# Altium integrated library Rosenberger HSD.IntLib: 118 symbols (part 1 of 2) (continued)
## D4S10A-400L5-C-RECEIVER (continued)
HSD Straight Plug, Coding C (Blue), Up to 5 GBit/s Per Pair, Receiver Side; PartNumber: D4S10A-400L5-C-RECEIVER; Design Note 1: Footprint in library is a generic example - only application specific footprint delivers High Performance; Design Note 2: A HSD 1-to-1 connection always needs an Emitter AND Receiver symbol, because the cable has a A->B direction, the pinning must be crossed.; DatasheetVersion: 902; PackageVersion: 902; PackageReference: D4S10A-400L5-C; PackageDescription: HSD Straight Plug, 12 x 14.15 x 15.4 mm; Coding: C (Blue); Mounting Technology: Through Hole; ComponentLink1Description: Manufacturer URL; ComponentLink1URL: http://www.rosenberger.de; ComponentLink2Description: Datasheet; ComponentLink2URL: http://rosenberger.de/ok/images/documents/db/D4S10A-400L5-Y.pdf; ComponentLink3Description: Package Specification; ComponentLink3URL: http://rosenberger.de/ok/images/documents/db/D4S10A-400L5-Y.pdf; ComponentLink4Description: Series Overview / Design Note; ComponentLink4URL: http://rosenberger.de/ok/images/documents/spez/hsd.pdf; ComponentLink5Description: Webshop / RFQ; ComponentLink5URL: http://www.rosenberger.com/en/contact/sales/
footprint ROS-D4S10A-400L5-C_V (HSD Straight Plug, 12x14.15x15.4mm, Rosenberger Recommended)
pins: 1, 2, 3, 4, MH
text: Pair A; Pair B

## D4S10A-400L5-D-EMITTER
designator P?
HSD Straight Plug, Coding D (Bordeaux), Up to 5 GBit/s Per Pair, Emitter Side; PartNumber: D4S10A-400L5-D-EMITTER; Design Note 1: Footprint in library is a generic example - only application specific footprint delivers High Performance; Design Note 2: A HSD 1-to-1 connection always needs an Emitter AND Receiver symbol, because the cable has a A->B direction, the pinning must be crossed.; DatasheetVersion: 902; PackageVersion: 902; PackageReference: D4S10A-400L5-D; PackageDescription: HSD Straight Plug, 12 x 14.15 x 15.4 mm; Coding: D (Bordeaux); Mounting Technology: Through Hole; ComponentLink1Description: Manufacturer URL; ComponentLink1URL: http://www.rosenberger.de; ComponentLink2Description: Datasheet; ComponentLink2URL: http://rosenberger.de/ok/images/documents/db/D4S10A-400L5-Y.pdf; ComponentLink3Description: Package Specification; ComponentLink3URL: http://rosenberger.de/ok/images/documents/db/D4S10A-400L5-Y.pdf; ComponentLink4Description: Series Overview / Design Note; ComponentLink4URL: http://rosenberger.de/ok/images/documents/spez/hsd.pdf; ComponentLink5Description: Webshop / RFQ; ComponentLink5URL: http://www.rosenberger.com/en/contact/sales/
footprint ROS-D4S10A-400L5-D_V (HSD Straight Plug, 12x14.15x15.4mm, Rosenberger Recommended)
pins: 1, 2, 3, 4, MH
text: Pair A; Pair B

## D4S10A-400L5-D-RECEIVER
designator P?
HSD Straight Plug, Coding D (Bordeaux), Up to 5 GBit/s Per Pair, Receiver Side; PartNumber: D4S10A-400L5-D-RECEIVER; Design Note 1: Footprint in library is a generic example - only application specific footprint delivers High Performance; Design Note 2: A HSD 1-to-1 connection always needs an Emitter AND Receiver symbol, because the cable has a A->B direction, the pinning must be crossed.; DatasheetVersion: 902; PackageVersion: 902; PackageReference: D4S10A-400L5-D; PackageDescription: HSD Straight Plug, 12 x 14.15 x 15.4 mm; Coding: D (Bordeaux); Mounting Technology: Through Hole; ComponentLink1Description: Manufacturer URL; ComponentLink1URL: http://www.rosenberger.de; ComponentLink2Description: Datasheet; ComponentLink2URL: http://rosenberger.de/ok/images/documents/db/D4S10A-400L5-Y.pdf; ComponentLink3Description: Package Specification; ComponentLink3URL: http://rosenberger.de/ok/images/documents/db/D4S10A-400L5-Y.pdf; ComponentLink4Description: Series Overview / Design Note; ComponentLink4URL: http://rosenberger.de/ok/images/documents/spez/hsd.pdf; ComponentLink5Description: Webshop / RFQ; ComponentLink5URL: http://www.rosenberger.com/en/contact/sales/
footprint ROS-D4S10A-400L5-D_V (HSD Straight Plug, 12x14.15x15.4mm, Rosenberger Recommended)
pins: 1, 2, 3, 4, MH
text: Pair A; Pair B

## D4S10A-400L5-E-EMITTER
designator P?
HSD Straight Plug, Coding E (Green), Up to 5 GBit/s Per Pair, Emitter Side; PartNumber: D4S10A-400L5-E-EMITTER; Design Note 1: Footprint in library is a generic example - only application specific footprint delivers High Performance; Design Note 2: A HSD 1-to-1 connection always needs an Emitter AND Receiver symbol, because the cable has a A->B direction, the pinning must be crossed.; DatasheetVersion: 902; PackageVersion: 902; PackageReference: D4S10A-400L5-E; PackageDescription: HSD Straight Plug, 12 x 14.15 x 15.4 mm; Coding: E (Green); Mounting Technology: Through Hole; ComponentLink1Description: Manufacturer URL; ComponentLink1URL: http://www.rosenberger.de; ComponentLink2Description: Datasheet; ComponentLink2URL: http://rosenberger.de/ok/images/documents/db/D4S10A-400L5-Y.pdf; ComponentLink3Description: Package Specification; ComponentLink3URL: http://rosenberger.de/ok/images/documents/db/D4S10A-400L5-Y.pdf; ComponentLink4Description: Series Overview / Design Note; ComponentLink4URL: http://rosenberger.de/ok/images/documents/spez/hsd.pdf; ComponentLink5Description: Webshop / RFQ; ComponentLink5URL: http://www.rosenberger.com/en/contact/sales/
footprint ROS-D4S10A-400L5-E_V (HSD Straight Plug, 12x14.15x15.4mm, Rosenberger Recommended)
pins: 1, 2, 3, 4, MH
text: Pair A; Pair B

## D4S10A-400L5-E-RECEIVER
designator P?
HSD Straight Plug, Coding E (Green), Up to 5 GBit/s Per Pair, Receiver Side; PartNumber: D4S10A-400L5-E-RECEIVER; Design Note 1: Footprint in library is a generic example - only application specific footprint delivers High Performance; Design Note 2: A HSD 1-to-1 connection always needs an Emitter AND Receiver symbol, because the cable has a A->B direction, the pinning must be crossed.; DatasheetVersion: 902; PackageVersion: 902; PackageReference: D4S10A-400L5-E; PackageDescription: HSD Straight Plug, 12 x 14.15 x 15.4 mm; Coding: E (Green); Mounting Technology: Through Hole; ComponentLink1Description: Manufacturer URL; ComponentLink1URL: http://www.rosenberger.de; ComponentLink2Description: Datasheet; ComponentLink2URL: http://rosenberger.de/ok/images/documents/db/D4S10A-400L5-Y.pdf; ComponentLink3Description: Package Specification; ComponentLink3URL: http://rosenberger.de/ok/images/documents/db/D4S10A-400L5-Y.pdf; ComponentLink4Description: Series Overview / Design Note; ComponentLink4URL: http://rosenberger.de/ok/images/documents/spez/hsd.pdf; ComponentLink5Description: Webshop / RFQ; ComponentLink5URL: http://www.rosenberger.com/en/contact/sales/
footprint ROS-D4S10A-400L5-E_V (HSD Straight Plug, 12x14.15x15.4mm, Rosenberger Recommended)
pins: 1, 2, 3, 4, MH
text: Pair A; Pair B

## D4S10A-400L5-F-EMITTER
designator P?
HSD Straight Plug, Coding F (Brown), Up to 5 GBit/s Per Pair, Emitter Side; PartNumber: D4S10A-400L5-F-EMITTER; Design Note 1: Footprint in library is a generic example - only application specific footprint delivers High Performance; Design Note 2: A HSD 1-to-1 connection always needs an Emitter AND Receiver symbol, because the cable has a A->B direction, the pinning must be crossed.; DatasheetVersion: 902; PackageVersion: 902; PackageReference: D4S10A-400L5-F; PackageDescription: HSD Straight Plug, 12 x 14.15 x 15.4 mm; Coding: F (Brown); Mounting Technology: Through Hole; ComponentLink1Description: Manufacturer URL; ComponentLink1URL: http://www.rosenberger.de; ComponentLink2Description: Datasheet; ComponentLink2URL: http://rosenberger.de/ok/images/documents/db/D4S10A-400L5-Y.pdf; ComponentLink3Description: Package Specification; ComponentLink3URL: http://rosenberger.de/ok/images/documents/db/D4S10A-400L5-Y.pdf; ComponentLink4Description: Series Overview / Design Note; ComponentLink4URL: http://rosenberger.de/ok/images/documents/spez/hsd.pdf; ComponentLink5Description: Webshop / RFQ; ComponentLink5URL: http://www.rosenberger.com/en/contact/sales/
footprint ROS-D4S10A-400L5-F_V (HSD Straight Plug, 12x14.15x15.4mm, Rosenberger Recommended)
pins: 1, 2, 3, 4, MH
text: Pair A; Pair B

## D4S10A-400L5-F-RECEIVER
designator P?
HSD Straight Plug, Coding F (Brown), Up to 5 GBit/s Per Pair, Receiver Side; PartNumber: D4S10A-400L5-F-RECEIVER; Design Note 1: Footprint in library is a generic example - only application specific footprint delivers High Performance; Design Note 2: A HSD 1-to-1 connection always needs an Emitter AND Receiver symbol, because the cable has a A->B direction, the pinning must be crossed.; DatasheetVersion: 902; PackageVersion: 902; PackageReference: D4S10A-400L5-F; PackageDescription: HSD Straight Plug, 12 x 14.15 x 15.4 mm; Coding: F (Brown); Mounting Technology: Through Hole; ComponentLink1Description: Manufacturer URL; ComponentLink1URL: http://www.rosenberger.de; ComponentLink2Description: Datasheet; ComponentLink2URL: http://rosenberger.de/ok/images/documents/db/D4S10A-400L5-Y.pdf; ComponentLink3Description: Package Specification; ComponentLink3URL: http://rosenberger.de/ok/images/documents/db/D4S10A-400L5-Y.pdf; ComponentLink4Description: Series Overview / Design Note; ComponentLink4URL: http://rosenberger.de/ok/images/documents/spez/hsd.pdf; ComponentLink5Description: Webshop / RFQ; ComponentLink5URL: http://www.rosenberger.com/en/contact/sales/
footprint ROS-D4S10A-400L5-F_V (HSD Straight Plug, 12x14.15x15.4mm, Rosenberger Recommended)
pins: 1, 2, 3, 4, MH
text: Pair A; Pair B

## D4S10A-400L5-Z-EMITTER
designator P?
HSD Straight Plug, Coding Z (Waterblue), Up to 5 GBit/s Per Pair, Emitter Side; PartNumber: D4S10A-400L5-Z-EMITTER; Design Note 1: Footprint in library is a generic example - only application specific footprint delivers High Performance; Design Note 2: A HSD 1-to-1 connection always needs an Emitter AND Receiver symbol, because the cable has a A->B direction, the pinning must be crossed.; DatasheetVersion: 902; PackageVersion: 902; PackageReference: D4S10A-400L5-Z; PackageDescription: HSD Straight Plug, 12 x 14.15 x 15.4 mm; Coding: Z (Waterblue); Mounting Technology: Through Hole; ComponentLink1Description: Manufacturer URL; ComponentLink1URL: http://www.rosenberger.de; ComponentLink2Description: Datasheet; ComponentLink2URL: http://rosenberger.de/ok/images/documents/db/D4S10A-400L5-Y.pdf; ComponentLink3Description: Package Specification; ComponentLink3URL: http://rosenberger.de/ok/images/documents/db/D4S10A-400L5-Y.pdf; ComponentLink4Description: Series Overview / Design Note; ComponentLink4URL: http://rosenberger.de/ok/images/documents/spez/hsd.pdf; ComponentLink5Description: Webshop / RFQ; ComponentLink5URL: http://www.rosenberger.com/en/contact/sales/
footprint ROS-D4S10A-400L5-Z_V (HSD Straight Plug, 12x14.15x15.4mm, Rosenberger Recommended)
pins: 1, 2, 3, 4, MH
text: Pair A; Pair B

## D4S10A-400L5-Z-RECEIVER
designator P?
HSD Straight Plug, Coding Z (Waterblue), Up to 5 GBit/s Per Pair, Receiver Side; PartNumber: D4S10A-400L5-Z-RECEIVER; Design Note 1: Footprint in library is a generic example - only application specific footprint delivers High Performance; Design Note 2: A HSD 1-to-1 connection always needs an Emitter AND Receiver symbol, because the cable has a A->B direction, the pinning must be crossed.; DatasheetVersion: 902; PackageVersion: 902; PackageReference: D4S10A-400L5-Z; PackageDescription: HSD Straight Plug, 12 x 14.15 x 15.4 mm; Coding: Z (Waterblue); Mounting Technology: Through Hole; ComponentLink1Description: Manufacturer URL; ComponentLink1URL: http://www.rosenberger.de; ComponentLink2Description: Datasheet; ComponentLink2URL: http://rosenberger.de/ok/images/documents/db/D4S10A-400L5-Y.pdf; ComponentLink3Description: Package Specification; ComponentLink3URL: http://rosenberger.de/ok/images/documents/db/D4S10A-400L5-Y.pdf; ComponentLink4Description: Series Overview / Design Note; ComponentLink4URL: http://rosenberger.de/ok/images/documents/spez/hsd.pdf; ComponentLink5Description: Webshop / RFQ; ComponentLink5URL: http://www.rosenberger.com/en/contact/sales/
footprint ROS-D4S10A-400L5-Z_V (HSD Straight Plug, 12x14.15x15.4mm, Rosenberger Recommended)
pins: 1, 2, 3, 4, MH
text: Pair A; Pair B

## D4S10E-40MA5-A-EMITTER
designator P?
HSD Straight Plug, Pin in Paste, Coding A (Black), Up to 5 GBit/s Per Pair, Emitter Side; PartNumber: D4S10E-40MA5-A-EMITTER; Design Note 1: Footprint in library is a generic example - only application specific footprint delivers High Performance; Design Note 2: A HSD 1-to-1 connection always needs an Emitter AND Receiver symbol, because the cable has a A->B direction, the pinning must be crossed.; DatasheetVersion: a00; PackageVersion: a00; PackageReference: D4S10E-40MA5-A; PackageDescription: HSD Straight Plug, Pin in Paste, 14.15 x 12.00 x 15.40 mm; Coding: A (Black); Mounting Technology: Pin-in-Paste; ComponentLink1Description: Manufacturer URL; ComponentLink1URL: http://www.rosenberger.de; ComponentLink2Description: Datasheet; ComponentLink2URL: http://rosenberger.de/ok/images/documents/db/D4S10E-40MA5-Y.pdf; ComponentLink3Description: Package Specification; ComponentLink3URL: http://rosenberger.de/ok/images/documents/db/D4S10E-40MA5-Y.pdf; ComponentLink4Description: Series Overview / Design Note; ComponentLink4URL: http://rosenberger.de/ok/images/documents/spez/hsd.pdf; ComponentLink5Description: Webshop / RFQ; ComponentLink5URL: http://www.rosenberger.com/en/contact/sales/
footprint ROS-D4S10E-40MA5-A_V (HSD Straight Plug, Pin in Paste, 14.15x12.00x15.40 mm, Rosenberger Recommended)
pins: 1, 2, 3, 4, MH
text: Pair A; Pair B

## D4S10E-40MA5-A-RECEIVER
designator P?
HSD Straight Plug, Pin in Paste, Coding A (Black), Up to 5 GBit/s Per Pair, Receiver Side; PartNumber: D4S10E-40MA5-A-RECEIVER; Design Note 1: Footprint in library is a generic example - only application specific footprint delivers High Performance; Design Note 2: A HSD 1-to-1 connection always needs an Emitter AND Receiver symbol, because the cable has a A->B direction, the pinning must be crossed.; DatasheetVersion: a00; PackageVersion: a00; PackageReference: D4S10E-40MA5-A; PackageDescription: HSD Straight Plug, Pin in Paste, 14.15 x 12.00 x 15.40 mm; Coding: A (Black); Mounting Technology: Pin-in-Paste; ComponentLink1Description: Manufacturer URL; ComponentLink1URL: http://www.rosenberger.de; ComponentLink2Description: Datasheet; ComponentLink2URL: http://rosenberger.de/ok/images/documents/db/D4S10E-40MA5-Y.pdf; ComponentLink3Description: Package Specification; ComponentLink3URL: http://rosenberger.de/ok/images/documents/db/D4S10E-40MA5-Y.pdf; ComponentLink4Description: Series Overview / Design Note; ComponentLink4URL: http://rosenberger.de/ok/images/documents/spez/hsd.pdf; ComponentLink5Description: Webshop / RFQ; ComponentLink5URL: http://www.rosenberger.com/en/contact/sales/
footprint ROS-D4S10E-40MA5-A_V (HSD Straight Plug, Pin in Paste, 14.15x12.00x15.40 mm, Rosenberger Recommended)
pins: 1, 2, 3, 4, MH
text: Pair A; Pair B

## D4S10E-40MA5-B-EMITTER
designator P?
HSD Straight Plug, Pin in Paste, Coding B (White), Up to 5 GBit/s Per Pair, Emitter Side; PartNumber: D4S10E-40MA5-B-EMITTER; Design Note 1: Footprint in library is a generic example - only application specific footprint delivers High Performance; Design Note 2: A HSD 1-to-1 connection always needs an Emitter AND Receiver symbol, because the cable has a A->B direction, the pinning must be crossed.; DatasheetVersion: a00; PackageVersion: a00; PackageReference: D4S10E-40MA5-B; PackageDescription: HSD Straight Plug, Pin in Paste, 14.15 x 12.00 x 15.40 mm; Coding: B (White); Mounting Technology: Pin-in-Paste; ComponentLink1Description: Manufacturer URL; ComponentLink1URL: http://www.rosenberger.de; ComponentLink2Description: Datasheet; ComponentLink2URL: http://rosenberger.de/ok/images/documents/db/D4S10E-40MA5-Y.pdf; ComponentLink3Description: Package Specification; ComponentLink3URL: http://rosenberger.de/ok/images/documents/db/D4S10E-40MA5-Y.pdf; ComponentLink4Description: Series Overview / Design Note; ComponentLink4URL: http://rosenberger.de/ok/images/documents/spez/hsd.pdf; ComponentLink5Description: Webshop / RFQ; ComponentLink5URL: http://www.rosenberger.com/en/contact/sales/
footprint ROS-D4S10E-40MA5-B_V (HSD Straight Plug, Pin in Paste, 14.15x12.00x15.40 mm, Rosenberger Recommended)
pins: 1, 2, 3, 4, MH
text: Pair A; Pair B

## D4S10E-40MA5-B-RECEIVER
designator P?
HSD Straight Plug, Pin in Paste, Coding B (White), Up to 5 GBit/s Per Pair, Receiver Side; PartNumber: D4S10E-40MA5-B-RECEIVER; Design Note 1: Footprint in library is a generic example - only application specific footprint delivers High Performance; Design Note 2: A HSD 1-to-1 connection always needs an Emitter AND Receiver symbol, because the cable has a A->B direction, the pinning must be crossed.; DatasheetVersion: a00; PackageVersion: a00; PackageReference: D4S10E-40MA5-B; PackageDescription: HSD Straight Plug, Pin in Paste, 14.15 x 12.00 x 15.40 mm; Coding: B (White); Mounting Technology: Pin-in-Paste; ComponentLink1Description: Manufacturer URL; ComponentLink1URL: http://www.rosenberger.de; ComponentLink2Description: Datasheet; ComponentLink2URL: http://rosenberger.de/ok/images/documents/db/D4S10E-40MA5-Y.pdf; ComponentLink3Description: Package Specification; ComponentLink3URL: http://rosenberger.de/ok/images/documents/db/D4S10E-40MA5-Y.pdf; ComponentLink4Description: Series Overview / Design Note; ComponentLink4URL: http://rosenberger.de/ok/images/documents/spez/hsd.pdf; ComponentLink5Description: Webshop / RFQ; ComponentLink5URL: http://www.rosenberger.com/en/contact/sales/
footprint ROS-D4S10E-40MA5-B_V (HSD Straight Plug, Pin in Paste, 14.15x12.00x15.40 mm, Rosenberger Recommended)
pins: 1, 2, 3, 4, MH
text: Pair A; Pair B

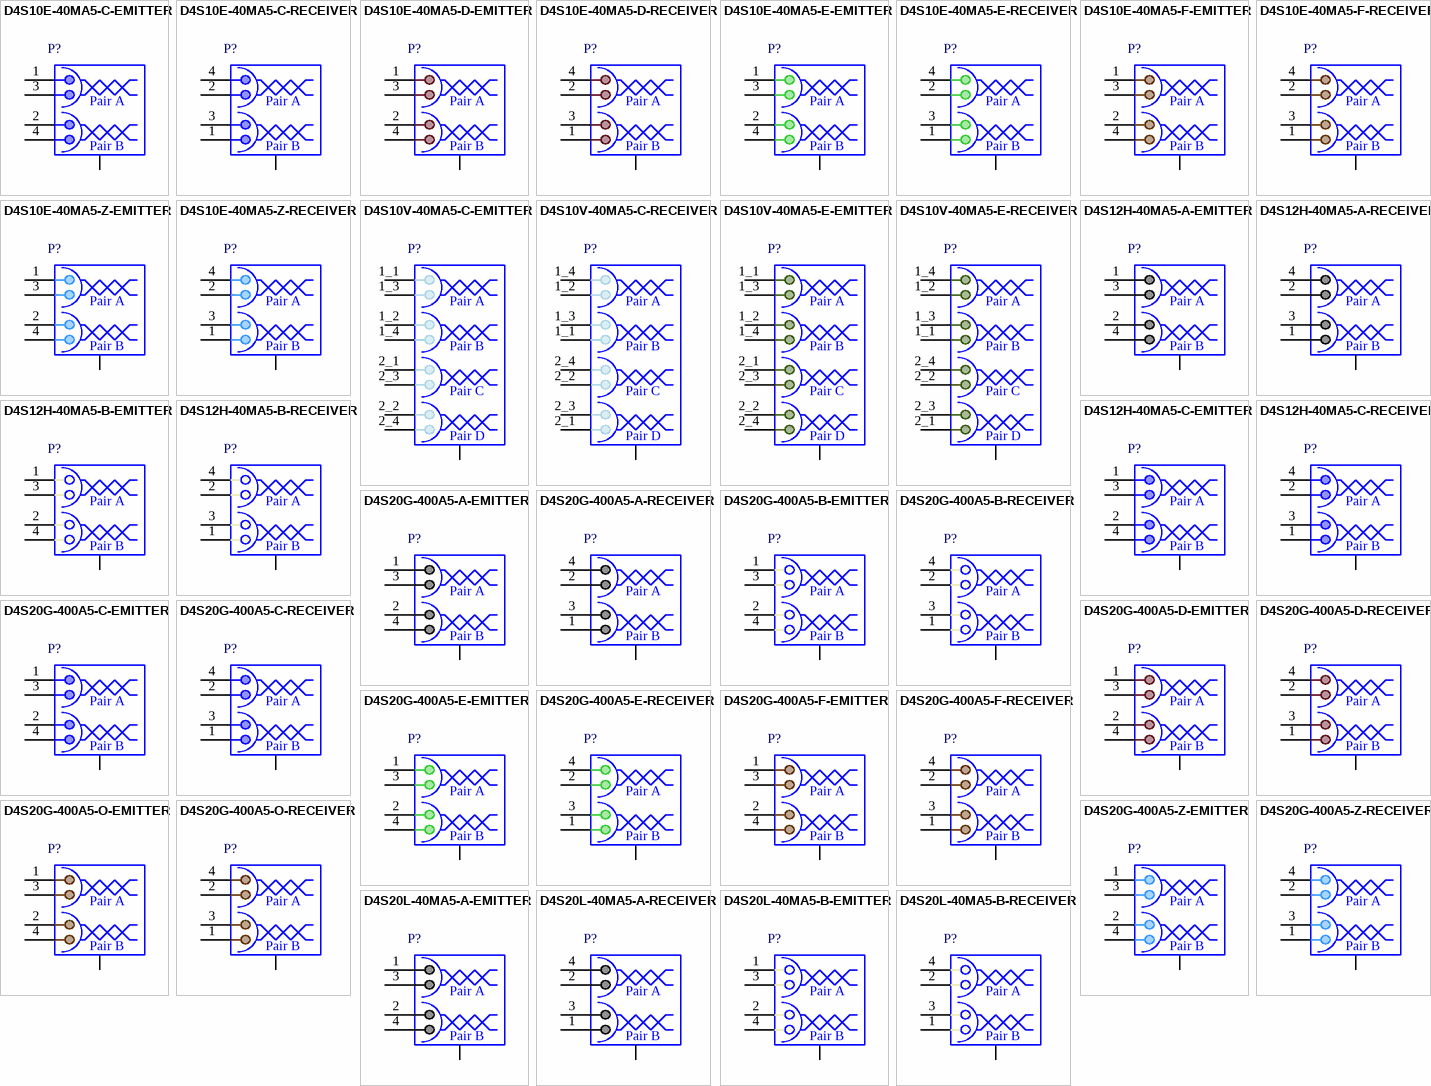
[diagram p1: symbols D4S10E-40MA5-C-EMITTER to D4S20L-40MA5-B-RECEIVER]

## D4S10E-40MA5-C-EMITTER
designator P?
HSD Straight Plug, Pin in Paste, Coding C (Blue), Up to 5 GBit/s Per Pair, Emitter Side; PartNumber: D4S10E-40MA5-C-EMITTER; Design Note 1: Footprint in library is a generic example - only application specific footprint delivers High Performance; Design Note 2: A HSD 1-to-1 connection always needs an Emitter AND Receiver symbol, because the cable has a A->B direction, the pinning must be crossed.; DatasheetVersion: a00; PackageVersion: a00; PackageReference: D4S10E-40MA5-C; PackageDescription: HSD Straight Plug, Pin in Paste, 14.15 x 12.00 x 15.40 mm; Coding: C (Blue); Mounting Technology: Pin-in-Paste; ComponentLink1Description: Manufacturer URL; ComponentLink1URL: http://www.rosenberger.de; ComponentLink2Description: Datasheet; ComponentLink2URL: http://rosenberger.de/ok/images/documents/db/D4S10E-40MA5-Y.pdf; ComponentLink3Description: Package Specification; ComponentLink3URL: http://rosenberger.de/ok/images/documents/db/D4S10E-40MA5-Y.pdf; ComponentLink4Description: Series Overview / Design Note; ComponentLink4URL: http://rosenberger.de/ok/images/documents/spez/hsd.pdf; ComponentLink5Description: Webshop / RFQ; ComponentLink5URL: http://www.rosenberger.com/en/contact/sales/
footprint ROS-D4S10E-40MA5-C_V (HSD Straight Plug, Pin in Paste, 14.15x12.00x15.40 mm, Rosenberger Recommended)
pins: 1, 2, 3, 4, MH
text: Pair A; Pair B

## D4S10E-40MA5-C-RECEIVER
designator P?
HSD Straight Plug, Pin in Paste, Coding C (Blue), Up to 5 GBit/s Per Pair, Receiver Side; PartNumber: D4S10E-40MA5-C-RECEIVER; Design Note 1: Footprint in library is a generic example - only application specific footprint delivers High Performance; Design Note 2: A HSD 1-to-1 connection always needs an Emitter AND Receiver symbol, because the cable has a A->B direction, the pinning must be crossed.; DatasheetVersion: a00; PackageVersion: a00; PackageReference: D4S10E-40MA5-C; PackageDescription: HSD Straight Plug, Pin in Paste, 14.15 x 12.00 x 15.40 mm; Coding: C (Blue); Mounting Technology: Pin-in-Paste; ComponentLink1Description: Manufacturer URL; ComponentLink1URL: http://www.rosenberger.de; ComponentLink2Description: Datasheet; ComponentLink2URL: http://rosenberger.de/ok/images/documents/db/D4S10E-40MA5-Y.pdf; ComponentLink3Description: Package Specification; ComponentLink3URL: http://rosenberger.de/ok/images/documents/db/D4S10E-40MA5-Y.pdf; ComponentLink4Description: Series Overview / Design Note; ComponentLink4URL: http://rosenberger.de/ok/images/documents/spez/hsd.pdf; ComponentLink5Description: Webshop / RFQ; ComponentLink5URL: http://www.rosenberger.com/en/contact/sales/
footprint ROS-D4S10E-40MA5-C_V (HSD Straight Plug, Pin in Paste, 14.15x12.00x15.40 mm, Rosenberger Recommended)
pins: 1, 2, 3, 4, MH
text: Pair A; Pair B

## D4S10E-40MA5-D-EMITTER
designator P?
HSD Straight Plug, Pin in Paste, Coding D (Bordeaux)), Up to 5 GBit/s Per Pair, Emitter Side; PartNumber: D4S10E-40MA5-D-EMITTER; Design Note 1: Footprint in library is a generic example - only application specific footprint delivers High Performance; Design Note 2: A HSD 1-to-1 connection always needs an Emitter AND Receiver symbol, because the cable has a A->B direction, the pinning must be crossed.; DatasheetVersion: a00; PackageVersion: a00; PackageReference: D4S10E-40MA5-D; PackageDescription: HSD Straight Plug, Pin in Paste, 14.15 x 12.00 x 15.40 mm; Coding: D (Bordeaux); Mounting Technology: Pin-in-Paste; ComponentLink1Description: Manufacturer URL; ComponentLink1URL: http://www.rosenberger.de; ComponentLink2Description: Datasheet; ComponentLink2URL: http://rosenberger.de/ok/images/documents/db/D4S10E-40MA5-Y.pdf; ComponentLink3Description: Package Specification; ComponentLink3URL: http://rosenberger.de/ok/images/documents/db/D4S10E-40MA5-Y.pdf; ComponentLink4Description: Series Overview / Design Note; ComponentLink4URL: http://rosenberger.de/ok/images/documents/spez/hsd.pdf; ComponentLink5Description: Webshop / RFQ; ComponentLink5URL: http://www.rosenberger.com/en/contact/sales/
footprint ROS-D4S10E-40MA5-D_V (HSD Straight Plug, Pin in Paste, 14.15x12.00x15.40 mm, Rosenberger Recommended)
pins: 1, 2, 3, 4, MH
text: Pair A; Pair B

## D4S10E-40MA5-D-RECEIVER
designator P?
HSD Straight Plug, Pin in Paste, Coding D (Bordeaux)), Up to 5 GBit/s Per Pair, Receiver Side; PartNumber: D4S10E-40MA5-D-RECEIVER; Design Note 1: Footprint in library is a generic example - only application specific footprint delivers High Performance; Design Note 2: A HSD 1-to-1 connection always needs an Emitter AND Receiver symbol, because the cable has a A->B direction, the pinning must be crossed.; DatasheetVersion: a00; PackageVersion: a00; PackageReference: D4S10E-40MA5-D; PackageDescription: HSD Straight Plug, Pin in Paste, 14.15 x 12.00 x 15.40 mm; Coding: D (Bordeaux); Mounting Technology: Pin-in-Paste; ComponentLink1Description: Manufacturer URL; ComponentLink1URL: http://www.rosenberger.de; ComponentLink2Description: Datasheet; ComponentLink2URL: http://rosenberger.de/ok/images/documents/db/D4S10E-40MA5-Y.pdf; ComponentLink3Description: Package Specification; ComponentLink3URL: http://rosenberger.de/ok/images/documents/db/D4S10E-40MA5-Y.pdf; ComponentLink4Description: Series Overview / Design Note; ComponentLink4URL: http://rosenberger.de/ok/images/documents/spez/hsd.pdf; ComponentLink5Description: Webshop / RFQ; ComponentLink5URL: http://www.rosenberger.com/en/contact/sales/
footprint ROS-D4S10E-40MA5-D_V (HSD Straight Plug, Pin in Paste, 14.15x12.00x15.40 mm, Rosenberger Recommended)
pins: 1, 2, 3, 4, MH
text: Pair A; Pair B

## D4S10E-40MA5-E-EMITTER
designator P?
HSD Straight Plug, Pin in Paste, Coding E (Green), Up to 5 GBit/s Per Pair, Emitter Side; PartNumber: D4S10E-40MA5-E-EMITTER; Design Note 1: Footprint in library is a generic example - only application specific footprint delivers High Performance; Design Note 2: A HSD 1-to-1 connection always needs an Emitter AND Receiver symbol, because the cable has a A->B direction, the pinning must be crossed.; DatasheetVersion: a00; PackageVersion: a00; PackageReference: D4S10E-40MA5-E; PackageDescription: HSD Straight Plug, Pin in Paste, 14.15 x 12.00 x 15.40 mm; Coding: E (Green); Mounting Technology: Pin-in-Paste; ComponentLink1Description: Manufacturer URL; ComponentLink1URL: http://www.rosenberger.de; ComponentLink2Description: Datasheet; ComponentLink2URL: http://rosenberger.de/ok/images/documents/db/D4S10E-40MA5-Y.pdf; ComponentLink3Description: Package Specification; ComponentLink3URL: http://rosenberger.de/ok/images/documents/db/D4S10E-40MA5-Y.pdf; ComponentLink4Description: Series Overview / Design Note; ComponentLink4URL: http://rosenberger.de/ok/images/documents/spez/hsd.pdf; ComponentLink5Description: Webshop / RFQ; ComponentLink5URL: http://www.rosenberger.com/en/contact/sales/
footprint ROS-D4S10E-40MA5-E_V (HSD Straight Plug, Pin in Paste, 14.15x12.00x15.40 mm, Rosenberger Recommended)
pins: 1, 2, 3, 4, MH
text: Pair A; Pair B

## D4S10E-40MA5-E-RECEIVER
designator P?
HSD Straight Plug, Pin in Paste, Coding E (Green), Up to 5 GBit/s Per Pair, Receiver Side; PartNumber: D4S10E-40MA5-E-RECEIVER; Design Note 1: Footprint in library is a generic example - only application specific footprint delivers High Performance; Design Note 2: A HSD 1-to-1 connection always needs an Emitter AND Receiver symbol, because the cable has a A->B direction, the pinning must be crossed.; DatasheetVersion: a00; PackageVersion: a00; PackageReference: D4S10E-40MA5-E; PackageDescription: HSD Straight Plug, Pin in Paste, 14.15 x 12.00 x 15.40 mm; Coding: E (Green); Mounting Technology: Pin-in-Paste; ComponentLink1Description: Manufacturer URL; ComponentLink1URL: http://www.rosenberger.de; ComponentLink2Description: Datasheet; ComponentLink2URL: http://rosenberger.de/ok/images/documents/db/D4S10E-40MA5-Y.pdf; ComponentLink3Description: Package Specification; ComponentLink3URL: http://rosenberger.de/ok/images/documents/db/D4S10E-40MA5-Y.pdf; ComponentLink4Description: Series Overview / Design Note; ComponentLink4URL: http://rosenberger.de/ok/images/documents/spez/hsd.pdf; ComponentLink5Description: Webshop / RFQ; ComponentLink5URL: http://www.rosenberger.com/en/contact/sales/
footprint ROS-D4S10E-40MA5-E_V (HSD Straight Plug, Pin in Paste, 14.15x12.00x15.40 mm, Rosenberger Recommended)
pins: 1, 2, 3, 4, MH
text: Pair A; Pair B

## D4S10E-40MA5-F-EMITTER
designator P?
HSD Straight Plug, Pin in Paste, Coding F (Brown), Up to 5 GBit/s Per Pair, Emitter Side; PartNumber: D4S10E-40MA5-F-EMITTER; Design Note 1: Footprint in library is a generic example - only application specific footprint delivers High Performance; Design Note 2: A HSD 1-to-1 connection always needs an Emitter AND Receiver symbol, because the cable has a A->B direction, the pinning must be crossed.; DatasheetVersion: a00; PackageVersion: a00; PackageReference: D4S10E-40MA5-F; PackageDescription: HSD Straight Plug, Pin in Paste, 14.15 x 12.00 x 15.40 mm; Coding: F (Brown); Mounting Technology: Pin-in-Paste; ComponentLink1Description: Manufacturer URL; ComponentLink1URL: http://www.rosenberger.de; ComponentLink2Description: Datasheet; ComponentLink2URL: http://rosenberger.de/ok/images/documents/db/D4S10E-40MA5-Y.pdf; ComponentLink3Description: Package Specification; ComponentLink3URL: http://rosenberger.de/ok/images/documents/db/D4S10E-40MA5-Y.pdf; ComponentLink4Description: Series Overview / Design Note; ComponentLink4URL: http://rosenberger.de/ok/images/documents/spez/hsd.pdf; ComponentLink5Description: Webshop / RFQ; ComponentLink5URL: http://www.rosenberger.com/en/contact/sales/
footprint ROS-D4S10E-40MA5-F_V (HSD Straight Plug, Pin in Paste, 14.15x12.00x15.40 mm, Rosenberger Recommended)
pins: 1, 2, 3, 4, MH
text: Pair A; Pair B

## D4S10E-40MA5-F-RECEIVER
designator P?
HSD Straight Plug, Pin in Paste, Coding F (Brown), Up to 5 GBit/s Per Pair, Receiver Side; PartNumber: D4S10E-40MA5-F-RECEIVER; Design Note 1: Footprint in library is a generic example - only application specific footprint delivers High Performance; Design Note 2: A HSD 1-to-1 connection always needs an Emitter AND Receiver symbol, because the cable has a A->B direction, the pinning must be crossed.; DatasheetVersion: a00; PackageVersion: a00; PackageReference: D4S10E-40MA5-F; PackageDescription: HSD Straight Plug, Pin in Paste, 14.15 x 12.00 x 15.40 mm; Coding: F (Brown); Mounting Technology: Pin-in-Paste; ComponentLink1Description: Manufacturer URL; ComponentLink1URL: http://www.rosenberger.de; ComponentLink2Description: Datasheet; ComponentLink2URL: http://rosenberger.de/ok/images/documents/db/D4S10E-40MA5-Y.pdf; ComponentLink3Description: Package Specification; ComponentLink3URL: http://rosenberger.de/ok/images/documents/db/D4S10E-40MA5-Y.pdf; ComponentLink4Description: Series Overview / Design Note; ComponentLink4URL: http://rosenberger.de/ok/images/documents/spez/hsd.pdf; ComponentLink5Description: Webshop / RFQ; ComponentLink5URL: http://www.rosenberger.com/en/contact/sales/
footprint ROS-D4S10E-40MA5-F_V (HSD Straight Plug, Pin in Paste, 14.15x12.00x15.40 mm, Rosenberger Recommended)
pins: 1, 2, 3, 4, MH
text: Pair A; Pair B

## D4S10E-40MA5-Z-EMITTER
designator P?
HSD Straight Plug, Pin in Paste, Coding Z (WaterBlue), Up to 5 GBit/s Per Pair, Emitter Side; PartNumber: D4S10E-40MA5-Z-EMITTER; Design Note 1: Footprint in library is a generic example - only application specific footprint delivers High Performance; Design Note 2: A HSD 1-to-1 connection always needs an Emitter AND Receiver symbol, because the cable has a A->B direction, the pinning must be crossed.; DatasheetVersion: a00; PackageVersion: a00; PackageReference: D4S10E-40MA5-Z; PackageDescription: HSD Straight Plug, Pin in Paste, 14.15 x 12.00 x 15.40 mm; Coding: Z (Waterblue); Mounting Technology: Pin-in-Paste; ComponentLink1Description: Datasheet; ComponentLink1URL: http://rosenberger.de/ok/images/documents/db/D4S10E-40MA5-Y.pdf; ComponentLink2Description: Package Specification; ComponentLink2URL: http://rosenberger.de/ok/images/documents/db/D4S10E-40MA5-Y.pdf; ComponentLink3Description: Series Overview / Design Note; ComponentLink3URL: http://rosenberger.de/ok/images/documents/spez/hsd.pdf; ComponentLink4Description: Webshop / RFQ; ComponentLink4URL: http://www.rosenberger.com/en/contact/sales/
footprint ROS-D4S10E-40MA5-Z_V (HSD Straight Plug, Pin in Paste, 14.15x12.00x15.40 mm, Rosenberger Recommended)
pins: 1, 2, 3, 4, MH
text: Pair A; Pair B

## D4S10E-40MA5-Z-RECEIVER
designator P?
HSD Straight Plug, Pin in Paste, Coding Z (WaterBlue), Up to 5 GBit/s Per Pair, Receiver Side; PartNumber: D4S10E-40MA5-Z-RECEIVER; Design Note 1: Footprint in library is a generic example - only application specific footprint delivers High Performance; Design Note 2: A HSD 1-to-1 connection always needs an Emitter AND Receiver symbol, because the cable has a A->B direction, the pinning must be crossed.; DatasheetVersion: a00; PackageVersion: a00; PackageReference: D4S10E-40MA5-Z; PackageDescription: HSD Straight Plug, Pin in Paste, 14.15 x 12.00 x 15.40 mm; Coding: Z (Waterblue); Mounting Technology: Pin-in-Paste; ComponentLink1Description: Manufacturer URL; ComponentLink1URL: http://www.rosenberger.de; ComponentLink2Description: Datasheet; ComponentLink2URL: http://rosenberger.de/ok/images/documents/db/D4S10E-40MA5-Y.pdf; ComponentLink3Description: Package Specification; ComponentLink3URL: http://rosenberger.de/ok/images/documents/db/D4S10E-40MA5-Y.pdf; ComponentLink4Description: Series Overview / Design Note; ComponentLink4URL: http://rosenberger.de/ok/images/documents/spez/hsd.pdf; ComponentLink5Description: Webshop / RFQ; ComponentLink5URL: http://www.rosenberger.com/en/contact/sales/
footprint ROS-D4S10E-40MA5-Z_V (HSD Straight Plug, Pin in Paste, 14.15x12.00x15.40 mm, Rosenberger Recommended)
pins: 1, 2, 3, 4, MH
text: Pair A; Pair B

## D4S10V-40MA5-C-EMITTER
designator P?
Dual HSD Straight Plug, Pin in Paste, Coding C+D, Up to 5 GBit/s Per Pair, Emitter Side; PartNumber: D4S10V-40MA5-C-EMITTER; Coding: C (C+D light blue); Design Note 1: Footprint in library is a generic example - only application specific footprint delivers High Performance; Design Note 2: A HSD 1-to-1 connection always needs an Emitter AND Receiver symbol, because the cable has a A->B direction, the pinning must be crossed.; DatasheetVersion: 300; PackageVersion: 300; PackageReference: D4S10V-40MA5-C; PackageDescription: Dual HSD Straight Plug, Pin in Paste, 24.7 x 14.22 x 15.4 mm; Mounting Technology: Pin-in-Paste; ComponentLink1Description: Manufacturer URL; ComponentLink1URL: http://www.rosenberger.de; ComponentLink2Description: Datasheet; ComponentLink2URL: http://rosenberger.de/ok/images/documents/db/D4S10V-40MA5-Y.pdf; ComponentLink3Description: Package Specification; ComponentLink3URL: http://rosenberger.de/ok/images/documents/db/D4S10V-40MA5-Y.pdf; ComponentLink4Description: Series Overview / Design Note; ComponentLink4URL: http://rosenberger.de/ok/images/documents/spez/hsd.pdf; ComponentLink5Description: Webshop / RFQ; ComponentLink5URL: http://www.rosenberger.com/en/contact/sales/
footprint ROS-D4S10V-40MA5-C_V (Dual HSD Straight Plug, Pin in Paste, 24.7x14.22x15.4mm, Rosenberger Recommended)
pins: 1_1, 1_2, 1_3, 1_4, 2_1, 2_2, 2_3, 2_4, MH
text: Pair A; Pair B; Pair C; Pair D

## D4S10V-40MA5-C-RECEIVER
designator P?
Dual HSD Straight Plug, Pin in Paste, Coding C+D, Up to 5 GBit/s Per Pair, Receiver Side; PartNumber: D4S10V-40MA5-C-RECEIVER; Coding: C (C+D light blue); Design Note 1: Footprint in library is a generic example - only application specific footprint delivers High Performance; Design Note 2: A HSD 1-to-1 connection always needs an Emitter AND Receiver symbol, because the cable has a A->B direction, the pinning must be crossed.; DatasheetVersion: 300; PackageVersion: 300; PackageReference: D4S10V-40MA5-C; PackageDescription: Dual HSD Straight Plug, Pin in Paste, 24.7 x 14.22 x 15.4 mm; Mounting Technology: Pin-in-Paste; ComponentLink1Description: Manufacturer URL; ComponentLink1URL: http://www.rosenberger.de; ComponentLink2Description: Datasheet; ComponentLink2URL: http://rosenberger.de/ok/images/documents/db/D4S10V-40MA5-Y.pdf; ComponentLink3Description: Package Specification; ComponentLink3URL: http://rosenberger.de/ok/images/documents/db/D4S10V-40MA5-Y.pdf; ComponentLink4Description: Series Overview / Design Note; ComponentLink4URL: http://rosenberger.de/ok/images/documents/spez/hsd.pdf; ComponentLink5Description: Webshop / RFQ; ComponentLink5URL: http://www.rosenberger.com/en/contact/sales/
footprint ROS-D4S10V-40MA5-C_V (Dual HSD Straight Plug, Pin in Paste, 24.7x14.22x15.4mm, Rosenberger Recommended)
pins: 1_1, 1_2, 1_3, 1_4, 2_1, 2_2, 2_3, 2_4, MH
text: Pair A; Pair B; Pair C; Pair D

## D4S10V-40MA5-E-EMITTER
designator P?
Dual HSD Straight Plug, Pin in Paste, Coding E+F, Up to 5 GBit/s Per Pair, Emitter Side; PartNumber: D4S10V-40MA5-E-EMITTER; Coding: E (E+F may green); Design Note 1: Footprint in library is a generic example - only application specific footprint delivers High Performance; Design Note 2: A HSD 1-to-1 connection always needs an Emitter AND Receiver symbol, because the cable has a A->B direction, the pinning must be crossed.; DatasheetVersion: 300; PackageVersion: 300; PackageReference: D4S10V-40MA5-E; PackageDescription: Dual HSD Straight Plug, Pin in Paste, 24.7 x 14.22 x 15.4 mm; Mounting Technology: Pin-in-Paste; ComponentLink1Description: Manufacturer URL; ComponentLink1URL: http://www.rosenberger.de; ComponentLink2Description: Datasheet; ComponentLink2URL: http://rosenberger.de/ok/images/documents/db/D4S10V-40MA5-Y.pdf; ComponentLink3Description: Package Specification; ComponentLink3URL: http://rosenberger.de/ok/images/documents/db/D4S10V-40MA5-Y.pdf; ComponentLink4Description: Series Overview / Design Note; ComponentLink4URL: http://rosenberger.de/ok/images/documents/spez/hsd.pdf; ComponentLink5Description: Webshop / RFQ; ComponentLink5URL: http://www.rosenberger.com/en/contact/sales/
footprint ROS-D4S10V-40MA5-E_V (Dual HSD Straight Plug, Pin in Paste, 24.7x14.22x15.4mm, Rosenberger Recommended)
pins: 1_1, 1_2, 1_3, 1_4, 2_1, 2_2, 2_3, 2_4, MH
text: Pair A; Pair B; Pair C; Pair D

## D4S10V-40MA5-E-RECEIVER
designator P?
Dual HSD Straight Plug, Pin in Paste, Coding E+F, Up to 5 GBit/s Per Pair, Receiver Side; PartNumber: D4S10V-40MA5-E-RECEIVER; Coding: E (E+F may green); Design Note 1: Footprint in library is a generic example - only application specific footprint delivers High Performance; Design Note 2: A HSD 1-to-1 connection always needs an Emitter AND Receiver symbol, because the cable has a A->B direction, the pinning must be crossed.; DatasheetVersion: 300; PackageVersion: 300; PackageReference: D4S10V-40MA5-E; PackageDescription: Dual HSD Straight Plug, Pin in Paste, 24.7 x 14.22 x 15.4 mm; Mounting Technology: Pin-in-Paste; ComponentLink1Description: Manufacturer URL; ComponentLink1URL: http://www.rosenberger.de; ComponentLink2Description: Datasheet; ComponentLink2URL: http://rosenberger.de/ok/images/documents/db/D4S10V-40MA5-Y.pdf; ComponentLink3Description: Package Specification; ComponentLink3URL: http://rosenberger.de/ok/images/documents/db/D4S10V-40MA5-Y.pdf; ComponentLink4Description: Series Overview / Design Note; ComponentLink4URL: http://rosenberger.de/ok/images/documents/spez/hsd.pdf; ComponentLink5Description: Webshop / RFQ; ComponentLink5URL: http://www.rosenberger.com/en/contact/sales/
footprint ROS-D4S10V-40MA5-E_V (Dual HSD Straight Plug, Pin in Paste, 24.7x14.22x15.4mm, Rosenberger Recommended)
pins: 1_1, 1_2, 1_3, 1_4, 2_1, 2_2, 2_3, 2_4, MH
text: Pair A; Pair B; Pair C; Pair D

## D4S12H-40MA5-A-EMITTER
designator P?
HSD Straight Plug, Pin in Paste, Coding A (Black), Up to 5 GBit/s Per Pair, Emitter Side; PartNumber: D4S12H-40MA5-A-EMITTER; Design Note 1: Footprint in library is a generic example - only application specific footprint delivers High Performance; Design Note 2: A HSD 1-to-1 connection always needs an Emitter AND Receiver symbol, because the cable has a A->B direction, the pinning must be crossed.; DatasheetVersion: a00; PackageVersion: a00; PackageReference: D4S12H-40MA5-A; PackageDescription: HSD Straight Plug, 12 x 14.15 x 15.45 mm; Coding: A (Black); Mounting Technology: Pin-in-Paste; ComponentLink1Description: Manufacturer URL; ComponentLink1URL: http://www.rosenberger.de; ComponentLink2Description: Datasheet; ComponentLink2URL: http://rosenberger.de/ok/images/documents/db/D4S12H-40MA5-Y.pdf; ComponentLink3Description: Package Specification; ComponentLink3URL: http://rosenberger.de/ok/images/documents/db/D4S12H-40MA5-Y.pdf; ComponentLink4Description: Series Overview / Design Note; ComponentLink4URL: http://rosenberger.de/ok/images/documents/spez/hsd.pdf; ComponentLink5Description: Webshop / RFQ; ComponentLink5URL: http://www.rosenberger.com/en/contact/sales/
footprint ROS-D4S12H-40MA5-A_V (HSD Straight Plug, 12x14.15x15.45mm, Rosenberger Recommended)
pins: 1, 2, 3, 4, MH
text: Pair A; Pair B

## D4S12H-40MA5-A-RECEIVER
designator P?
HSD Straight Plug, Pin in Paste, Coding A (Black), Up to 5 GBit/s Per Pair, Receiver Side; PartNumber: D4S12H-40MA5-A-RECEIVER; Design Note 1: Footprint in library is a generic example - only application specific footprint delivers High Performance; Design Note 2: A HSD 1-to-1 connection always needs an Emitter AND Receiver symbol, because the cable has a A->B direction, the pinning must be crossed.; DatasheetVersion: a00; PackageVersion: a00; PackageReference: D4S12H-40MA5-A; PackageDescription: HSD Straight Plug, 12 x 14.15 x 15.45 mm; Coding: A (Black); Mounting Technology: Pin-in-Paste; ComponentLink1Description: Manufacturer URL; ComponentLink1URL: http://www.rosenberger.de; ComponentLink2Description: Datasheet; ComponentLink2URL: http://rosenberger.de/ok/images/documents/db/D4S12H-40MA5-Y.pdf; ComponentLink3Description: Package Specification; ComponentLink3URL: http://rosenberger.de/ok/images/documents/db/D4S12H-40MA5-Y.pdf; ComponentLink4Description: Series Overview / Design Note; ComponentLink4URL: http://rosenberger.de/ok/images/documents/spez/hsd.pdf; ComponentLink5Description: Webshop / RFQ; ComponentLink5URL: http://www.rosenberger.com/en/contact/sales/
footprint ROS-D4S12H-40MA5-A_V (HSD Straight Plug, 12x14.15x15.45mm, Rosenberger Recommended)
pins: 1, 2, 3, 4, MH
text: Pair A; Pair B

## D4S12H-40MA5-B-EMITTER
designator P?